# Altium footprint library connectors.PcbLib: 256 footprints (part 13 of 16)
Each footprint in its own frame and in the unit in brackets; x right, y up, seen from the top. Pads: shape width x height; smd on the part's side, far side on the other; paste and mask are expansions set on the pad; w line width, h text height; cw(c..) or ccw(c..) is an arc to the next point about the centre after c.
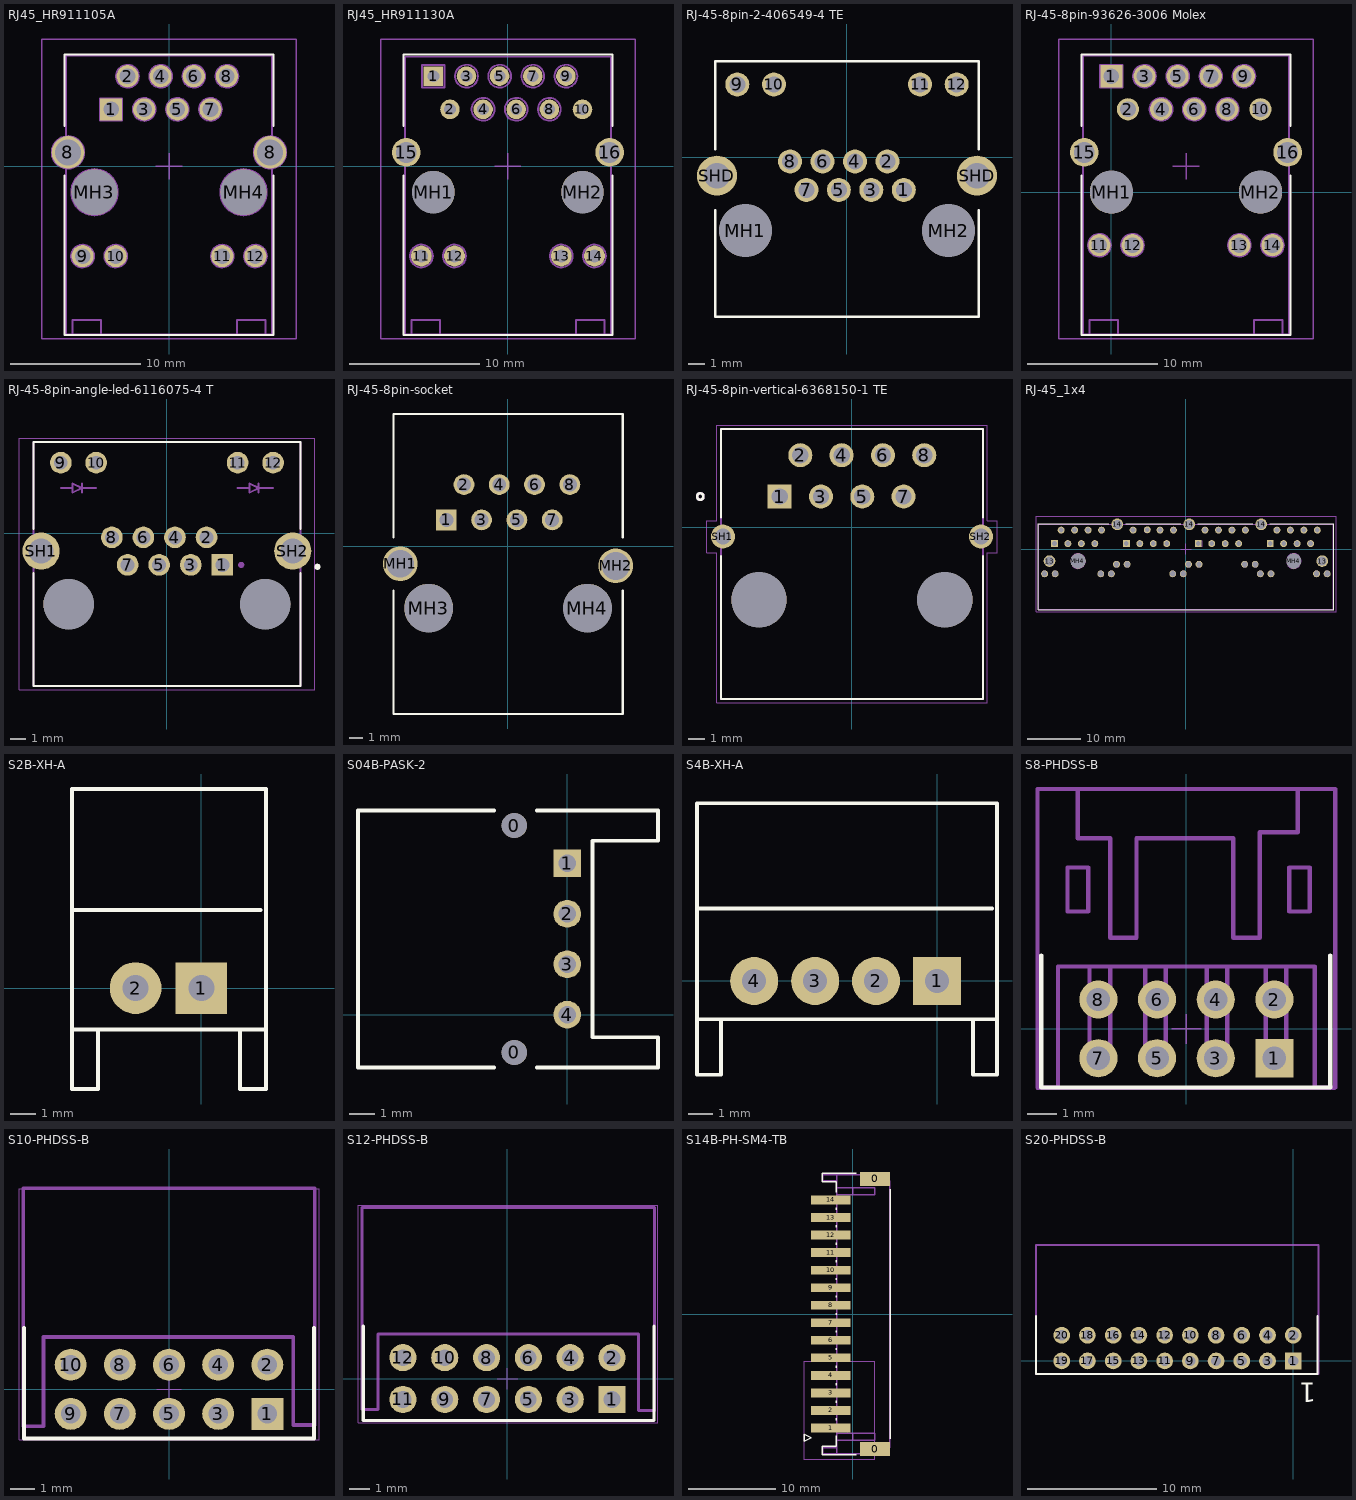
[diagram p12: the footprints below, top view; thin cyan lines are the x and y axes]

## RJ45_HR911105A [mm] "розетка на плату с трансформатором"
height 13
pads (16):
  rect 1.7x1.7 hole 1.2: 1(-4.44,4.355)
  round 1.7 hole 1.2: 2(-3.18,6.895) 3(-1.9,4.355) 4(-0.64,6.895) 5(0.64,4.355) 6(1.9,6.895) 7(3.18,4.355) 8(4.44,6.895) 9(-6.625,-6.895) 10(-4.085,-6.895) 11(4.085,-6.895) 12(6.625,-6.895)
  round 2.5 hole 2: 8(-7.745,1.055) 8(7.745,1.055)
  round 3.5 hole 3.5 unplated: MH3(-5.715,-1.995) MH4(5.715,-1.995)
Top Overlay:
  lines w0.15: -8,-0.725 -8,-12.95 8,-12.95 8,-0.725 ; -8,3.085 -8,8.55 8,8.55 8,3.085
TopAssy 13:
  circle w0.15: c-3.18,6.895 r0.875
  circle w0.15: c-0.64,6.895 r0.875
  circle w0.15: c1.9,6.895 r0.875
  circle w0.15: c4.44,6.895 r0.875
  circle w0.15: c3.18,4.355 r0.875
  circle w0.15: c0.64,4.355 r0.875
  circle w0.15: c-1.9,4.355 r0.875
  circle w0.15: c6.625,-6.895 r0.875
  circle w0.15: c4.085,-6.895 r0.875
  circle w0.15: c-4.085,-6.895 r0.875
  circle w0.15: c-6.625,-6.895 r0.875
  circle w0.15: c-7.745,1.055 r1.246
  circle w0.15: c7.745,1.055 r1.246
  circle w0.15: c-5.715,-1.995 r1.775
  circle w0.15: c5.715,-1.995 r1.775
  lines w0.15: -7.4,-12.9 -7.4,-11.8 -5.2,-11.8 -5.2,-12.9 ; 5.2,-12.9 5.2,-11.8 7.4,-11.8 7.4,-12.9 ; -7.9,-12.9 7.9,-12.9 7.9,8.5 -7.9,8.5 -7.9,-12.9 ; -5.3,3.5 -5.3,5.2 -3.6,5.2 -3.6,3.5 -5.3,3.5
TopCourt 15:
  lines w0.1: -1,0 1,0 ; 0,-1 0,1 ; -9.75,-13.25 -9.75,9.75 9.75,9.75 9.75,-13.25 -9.75,-13.25
3D body "User Library-HR911105A.step": height 13.51, standoff -2.99, extent -7.93,-12.915 7.95,8.485

## RJ45_HR911130A [mm] "розетка на плату с трансформатором 1000"
height 13.5
pads (18):
  rect 1.5x1.5 hole 0.9: 1(-5.715,6.895)
  round 1.5 hole 0.9: 2(-4.445,4.355) 3(-3.175,6.895) 4(-1.905,4.355) 5(-0.635,6.895) 6(0.635,4.355) 7(1.905,6.895) 8(3.175,4.355) 9(4.445,6.895) 10(5.715,4.355)
  round 1.6 hole 1: 11(-6.635,-6.895) 12(-4.095,-6.895) 13(4.095,-6.895) 14(6.635,-6.895)
  round 2.2 hole 1.6: 15(-7.795,1.055) 16(7.795,1.055)
  round 3.25 hole 3.25 unplated: MH1(-5.715,-1.995) MH2(5.715,-1.995)
Top Overlay:
  lines w0.15: -7.995,-0.73 -7.995,-12.955 8.005,-12.955 8.005,-0.73 ; -7.995,3.08 -7.995,8.545 8.005,8.545 8.005,3.08
TopAssy 13:
  circle w0.15: c5.72,-2 r1
  circle w0.15: c-5.71,-2 r1
  circle w0.15: c7.795,1.05 r0.8
  circle w0.15: c-7.795,1.05 r0.8
  circle w0.15: c-6.635,-6.895 r0.875
  circle w0.15: c-4.095,-6.895 r0.875
  circle w0.15: c4.095,-6.895 r0.875
  circle w0.15: c6.635,-6.895 r0.875
  circle w0.15: c-1.905,4.355 r0.875
  circle w0.15: c0.635,4.355 r0.875
  circle w0.15: c3.175,4.355 r0.875
  circle w0.15: c4.445,6.895 r0.875
  circle w0.15: c1.905,6.895 r0.875
  circle w0.15: c-0.635,6.895 r0.875
  circle w0.15: c-3.175,6.895 r0.875
  lines w0.15: -7.395,-12.905 -7.395,-11.805 -5.195,-11.805 -5.195,-12.905 ; 5.205,-12.905 5.205,-11.805 7.405,-11.805 7.405,-12.905 ; -7.895,-12.905 -7.895,8.385 7.905,8.385 7.905,-12.905 -7.895,-12.905 ; -6.575,6.04 -6.575,7.74 -4.875,7.74 -4.875,6.04 -6.575,6.04
TopCourt 15:
  lines w0.1: -1,0 1,0 ; 0,-1 0,1 ; -9.745,-13.255 9.755,-13.255 9.755,9.745 -9.745,9.745 -9.745,-13.255
3D body "HANRUN HY911130A.STEP": height 13.51, standoff -3.04, extent -8.015,-12.915 8.025,8.385

## RJ-45-8pin-2-406549-4 TE [mm] "розетка на плату 2-406549-4 TE"
height 10
pads (16):
  round 1.5 hole 1: 1(3.55,-2.03) 2(2.53,-0.25) 3(1.52,-2.03) 4(0.5,-0.25) 5(-0.51,-2.03) 6(-1.53,-0.25) 7(-2.54,-2.03) 8(-3.56,-0.25) 9(-6.86,4.57) 10(-4.57,4.57) 11(4.57,4.57) 12(6.86,4.57)
  round 3.3 hole 3.3: MH1(-6.35,-4.57) MH2(6.35,-4.57)
  round 2.5 hole 1.6: SHD(-8.13,-1.14) SHD(8.13,-1.14)
Top Overlay:
  lines w0.15: -8.25,-3.3 -8.25,-9.97 8.25,-9.97 8.25,-3.3 ; -8.25,0.51 -8.25,6.03 8.25,6.03 8.25,0.51
3D body "c-2-406549-4-r-3d.stp": height 14.57, standoff -4.15, extent -9.321,-10.818 9.322,5.903

## RJ-45-8pin-93626-3006 Molex [mm] "розетка на плату с трансформатором 1000"
height 13
pads (18):
  rect 1.7x1.7 hole 1.2: 1(0,8.89)
  round 1.7 hole 1.2: 2(1.27,6.35) 3(2.54,8.89) 4(3.81,6.35) 5(5.08,8.89) 6(6.35,6.35) 7(7.62,8.89) 8(8.89,6.35) 9(10.16,8.89) 10(11.43,6.35) 11(-0.92,-4.07) 12(1.62,-4.07) 13(9.81,-4.07) 14(12.35,-4.07)
  round 2.2 hole 1.6: 15(-2.08,3.05) 16(13.51,3.05)
  round 3.3 hole 3.3 unplated: MH1(0,0) MH2(11.43,0)
Top Overlay:
  lines w0.15: -2.28,1.265 -2.28,-10.96 13.72,-10.96 13.72,1.265 ; -2.28,5.075 -2.28,10.54 13.72,10.54 13.72,5.075
TopAssy 13:
  circle w0.15: c2.54,8.89 r0.875
  circle w0.15: c5.08,8.89 r0.875
  circle w0.15: c7.62,8.89 r0.875
  circle w0.15: c10.16,8.89 r0.875
  circle w0.15: c8.89,6.35 r0.875
  circle w0.15: c6.35,6.35 r0.875
  circle w0.15: c3.81,6.35 r0.875
  circle w0.15: c12.35,-4.07 r0.875
  circle w0.15: c9.81,-4.07 r0.875
  circle w0.15: c1.62,-4.07 r0.875
  circle w0.15: c-0.92,-4.07 r0.875
  circle w0.15: c-2.08,3.045 r0.8
  circle w0.15: c13.51,3.045 r0.8
  circle w0.15: c0.005,-0.005 r1
  circle w0.15: c11.435,-0.005 r1
  lines w0.15: -1.68,-10.91 -1.68,-9.81 0.52,-9.81 0.52,-10.91 ; 10.92,-10.91 10.92,-9.81 13.12,-9.81 13.12,-10.91 ; -2.18,-10.91 13.62,-10.91 13.62,10.49 -2.18,10.49 -2.18,-10.91 ; -0.86,8.035 0.84,8.035 0.84,9.735 -0.86,9.735 -0.86,8.035
TopCourt 15:
  lines w0.1: 4.72,1.99 6.72,1.99 ; 5.72,0.99 5.72,2.99 ; -4.03,-11.26 -4.03,11.74 15.47,11.74 15.47,-11.26 -4.03,-11.26
3D body "936263006.stp": height 15.21, standoff -3.29, extent -3.361,-10.8 14.791,10.57

## RJ-45-8pin-angle-led-6116075-4 T [mm] "RJ-45-8pin-angle-led-6116075-4 T"
pads (16):
  rect 1.4x1.4 hole 0.9: 1(3.58,-2.03)
  round 1.4 hole 0.9: 2(2.56,-0.25) 3(1.54,-2.03) 4(0.52,-0.25) 5(-0.5,-2.03) 6(-1.52,-0.25) 7(-2.54,-2.03) 8(-3.56,-0.25) 9(-6.86,4.57) 10(-4.57,4.57) 11(4.57,4.57) 12(6.86,4.57)
  round 2.4 hole 1.6: SH1(-8.13,-1.14) SH2(8.13,-1.14)
  round 3.25 hole 3.25 unplated: ""(-6.35,-4.57) ""(6.35,-4.57)
Top Overlay:
  circle w0.2: c9.727,-2.157 r0.1
  lines w0.127: -8.635,-2.55 -8.635,-9.85 8.635,-9.85 8.635,-2.55 ; -8.635,0.27 -8.635,5.9 8.635,5.9 8.635,0.27
TopAssy 13:
  circle w0.2: c4.8,-2.03 r0.1
  lines w0.127: -6.86,2.93 -6.1,2.93 ; -5.5,2.63 -5.5,2.93 ; -5.5,3.23 -5.5,2.93 ; -4.57,2.93 -5.5,2.93 ; 4.57,2.93 5.33,2.93 ; 5.93,2.63 5.93,2.93 ; 5.93,3.23 5.93,2.93 ; 6.86,2.93 5.93,2.93 ; -6.1,2.93 -6.1,2.63 -5.5,2.93 ; -6.1,2.93 -6.1,3.23 -5.5,2.93 ; 5.33,2.93 5.33,2.63 5.93,2.93 ; 5.33,2.93 5.33,3.23 5.93,2.93 ; -8.635,-9.85 8.635,-9.85 8.635,5.9 -8.635,5.9 -8.635,-9.85
TopCourt 15:
  lines w0.05: -9.56,-10.1 9.56,-10.1 9.56,6.15 -9.56,6.15 -9.56,-10.1
3D body "c-6116075-04-a-3d.stp": height 13.35, standoff -4.18, extent -8.299,-10.818 8.337,5.895

## RJ-45-8pin-socket [mm] "розетка на плату"
height 10
pads (12):
  rect 1.5x1.5 hole 1: 1(-4.44,1.905)
  round 1.5 hole 1: 2(-3.17,4.445) 3(-1.9,1.905) 4(-0.63,4.445) 5(0.64,1.905) 6(1.91,4.445) 7(3.18,1.905) 8(4.45,4.445)
  round 2.5 hole 2: MH1(-7.75,-1.255) MH2(7.75,-1.405)
  round 3.5 hole 3.5: MH3(-5.71,-4.445) MH4(5.72,-4.445)
Top Overlay:
  lines w0.15: -8.25,-3.175 -8.25,-12.065 8.26,-12.065 8.26,-3.175 ; -8.25,0.635 -8.25,9.525 8.26,9.525 8.26,0.635
3D body "User Library-rj45.step": height 11.5, standoff -3.3, extent -7.55,-11.9 7.55,5.7

## RJ-45-8pin-vertical-6368150-1 TE [mm] "розетка на плату 6368150-1 вертикальная"
height 16
pads (12):
  rect 1.478x1.478 hole 1: 1(-4.445,1.905)
  round 1.478 hole 1: 2(-3.175,4.445) 3(-1.905,1.905) 4(-0.635,4.445) 5(0.635,1.905) 6(1.905,4.445) 7(3.175,1.905) 8(4.445,4.445) SH1(-7.935,-0.555) SH2(7.935,-0.555)
  round 3.4 hole 3.4 unplated: ""(-5.715,-4.445) ""(5.715,-4.445)
Top Overlay:
  circle w0.152: c-9.33,1.905 r0.2
  lines w0.127: -8.06,-10.535 8.06,-10.535 ; -8.06,-10.495 -8.06,-1.745 ; -8.06,0.63 -8.06,6.005 ; -8.06,6.045 8.06,6.045 ; 8.06,-10.495 8.06,-1.745 ; 8.06,0.63 8.06,6.005
TopAssy 13:
  circle w0.152: c-9.33,1.905 r0.2
  lines w0.127: -8.06,-10.535 8.06,-10.535 ; -8.06,-10.495 -8.06,6.005 ; -8.06,6.045 8.06,6.045 ; 8.06,-10.495 8.06,6.005
TopCourt 15:
  lines w0.05: -8.92,-1.545 -8.92,0.425 -8.31,0.425 -8.31,6.295 8.31,6.295 8.31,0.425 8.92,0.425 8.92,-1.545 8.31,-1.545 8.31,-10.785 -8.31,-10.785 -8.31,-1.545 -8.92,-1.545
3D body "c-6368150-1-a-3d.stp": height 16.84, standoff -3.97, extent -8.06,-10.851 8.06,5.825

## RJ-45_1x4 [mm] "розетка на плату  MC001523 MULTICOMP"
height 10
pads (55):
  rect 1.3x1.3 hole 0.9: 1.1(-24.8,1.035) 2.1(-11.23,1.035) 3.1(2.34,1.035) 4.1(15.91,1.035)
  round 1.3 hole 0.9: 1.2(-23.53,3.575) 1.3(-22.26,1.035) 1.4(-20.99,3.575) 1.5(-19.72,1.035) 1.6(-18.45,3.575) 1.7(-17.18,1.035) 1.8(-15.91,3.575) 2.2(-9.96,3.575) 2.3(-8.69,1.035) 2.4(-7.275,3.635) 2.5(-6.15,1.035) 2.6(-4.88,3.575) 2.7(-3.61,1.035) 2.8(-2.34,3.575) 3.2(3.61,3.575) 3.3(4.88,1.035) 3.4(6.15,3.575) 3.5(7.42,1.035) 3.6(8.69,3.575) 3.7(9.96,1.035) 3.8(11.23,3.575) 4.2(17.18,3.575) 4.3(18.45,1.035) 4.4(19.72,3.575) 4.5(20.99,1.035) 4.6(22.26,3.575) 4.7(23.53,1.035) 4.8(24.8,3.575)
  round 1.3 hole 1: 1.9(-26.655,-4.665) 1.10(-24.655,-4.665) 1.11(-16.055,-4.665) 1.12(-14.055,-4.665) 2.9(-13.085,-2.865) 2.10(-11.085,-2.865) 2.11(-2.485,-4.665) 2.12(-0.485,-4.665) 3.9(0.485,-2.865) 3.10(2.485,-2.865) 3.11(11.085,-2.865) 3.12(13.085,-2.865) 4.9(14.055,-4.665) 4.10(16.055,-4.665) 4.11(24.655,-4.665) 4.12(26.655,-4.665)
  round 2.2 hole 1.7: 13(-25.725,-2.265) 13(25.725,-2.265) 14(-12.935,4.665) 14(0.635,4.665) 14(14.205,4.665)
  round 2.8 hole 2.8 unplated: MH4(-20.355,-2.265) MH4(20.355,-2.265)
Top Overlay:
  lines w0.15: -14.575,4.765 -27.875,4.765 -27.875,4.135 -27.875,-11.465 27.935,-11.465 27.935,4.765 15.825,4.765 ; -11.375,4.765 -0.975,4.765 ; 2.225,4.765 12.625,4.765
TopAssy 13:
  circle w0.15: c-25.725,-2.265 r0.85
  circle w0.15: c-12.935,4.665 r0.85
  circle w0.15: c0.635,4.665 r0.85
  circle w0.15: c14.205,4.665 r0.85
  circle w0.15: c2.485,-2.865 r0.5
  circle w0.15: c0.485,-2.865 r0.5
  circle w0.15: c-2.485,-4.665 r0.5
  circle w0.15: c-0.485,-4.665 r0.5
  circle w0.15: c-11.085,-2.865 r0.5
  circle w0.15: c-13.085,-2.865 r0.5
  circle w0.15: c13.085,-2.865 r0.5
  circle w0.15: c11.085,-2.865 r0.5
  circle w0.15: c20.355,-2.265 r1.4
  circle w0.15: c25.725,-2.265 r0.85
  circle w0.15: c14.055,-4.665 r0.5
  circle w0.15: c16.055,-4.665 r0.5
  circle w0.15: c24.655,-4.665 r0.5
  circle w0.15: c26.655,-4.665 r0.5
  circle w0.15: c17.17,3.575 r0.45
  circle w0.15: c19.71,3.575 r0.45
  circle w0.15: c22.25,3.575 r0.45
  circle w0.15: c24.79,3.575 r0.45
  circle w0.15: c23.53,1.035 r0.45
  circle w0.15: c20.99,1.035 r0.45
  circle w0.15: c18.45,1.035 r0.45
  circle w0.15: c4.88,1.035 r0.45
  circle w0.15: c7.42,1.035 r0.45
  circle w0.15: c9.96,1.035 r0.45
  circle w0.15: c11.22,3.575 r0.45
  circle w0.15: c8.68,3.575 r0.45
  circle w0.15: c6.14,3.575 r0.45
  circle w0.15: c3.6,3.575 r0.45
  circle w0.15: c-23.54,3.575 r0.45
  circle w0.15: c-21,3.575 r0.45
  circle w0.15: c-18.46,3.575 r0.45
  circle w0.15: c-15.92,3.575 r0.45
  circle w0.15: c-17.18,1.035 r0.45
  circle w0.15: c-19.72,1.035 r0.45
  circle w0.15: c-22.26,1.035 r0.45
  circle w0.15: c-8.69,1.035 r0.45
  circle w0.15: c-6.15,1.035 r0.45
  circle w0.15: c-3.61,1.035 r0.45
  circle w0.15: c-2.35,3.575 r0.45
  circle w0.15: c-4.89,3.575 r0.45
  circle w0.15: c-7.43,3.575 r0.45
  circle w0.15: c-9.97,3.575 r0.45
  circle w0.15: c-20.355,-2.265 r1.4
  circle w0.15: c-14.055,-4.665 r0.5
  circle w0.15: c-16.055,-4.665 r0.5
  circle w0.15: c-24.655,-4.665 r0.5
  circle w0.15: c-26.655,-4.665 r0.5
  lines w0.15: -27.775,-11.365 -27.775,4.665 27.825,4.665 27.825,-11.365 -27.775,-11.365 ; -25.275,0.535 -25.275,1.535 -24.275,1.535 -24.275,0.535 -25.275,0.535 ; -11.705,0.535 -10.705,0.535 -10.705,1.535 -11.705,1.535 -11.705,0.535 ; 2.05,0.535 3.05,0.535 3.05,1.535 2.05,1.535 2.05,0.535 ; 15.435,0.535 16.435,0.535 16.435,1.535 15.435,1.535 15.435,0.535
TopCourt 15:
  lines w0.1: -1,0 1,0 ; 0,-1 0,1 ; -28.275,-11.865 28.325,-11.865 28.325,6.235 -28.275,6.235 -28.275,-11.865
3D body "c-1734324-3-a-3d.stp": height 11.32, standoff -2.18, extent 11.525,-11.215 27.725,4.135
3D body "c-1734324-3-a-3d.stp": height 11.32, standoff -2.18, extent -1.775,-11.315 14.425,4.035
3D body "c-1734324-3-a-3d.stp": height 11.32, standoff -2.18, extent -14.975,-11.315 1.225,4.035
3D body "c-1734324-3-a-3d.stp": height 11.32, standoff -2.18, extent -27.775,-11.415 -11.575,3.935

## S2B-XH-A [mm] "Вилка на плату угловая, шаг 2.54мм"
height 2.65
pads (2):
  rect 2x2 hole 1: 1(0,0)
  round 2 hole 1: 2(-2.54,0)
Top Overlay:
  lines w0.15: -5,-1.6 2.4,-1.6 ; -5,3.02 2.3,3.02 ; -4,-1.6 -4,-3.9 -5,-3.9 -5,7.7 2.5,7.7 2.5,-3.9 1.5,-3.9 1.5,-1.6
3D body "S2B-XH-A-1.STEP": height 5.95, standoff -3.4, extent -5,-3.85 2.4,7.65

## S04B-PASK-2 [mm] "Гнездо на плату, угловое JST S04B-PASK-2"
height 6.5
pads (6):
  round 1 hole 1 unplated: 0(-2.1,-1.5) 0(-2.1,7.5)
  rect 1.1x1.1 hole 0.7: 1(0,6)
  round 1.1 hole 0.7: 2(0,4) 3(0,2) 4(0,0)
Top Overlay:
  lines w0.15: -2.9,-2.1 -8.3,-2.1 -8.3,8.1 -2.9,8.1 ; -1.2,-2.1 3.6,-2.1 3.6,-0.9 1,-0.9 1,6.9 3.6,6.9 3.6,8.1 -1.2,8.1
3D body "S04B-PASK-2.STEP": height 6.51, standoff -3.39, extent -8.2,-2 3.5,8

## S4B-XH-A [mm] "Вилка на плату угловая, шаг 2.54мм"
height 2.65
pads (4):
  rect 2x2 hole 1: 1(0,0)
  round 2 hole 1: 2(-2.54,0) 3(-5.08,0) 4(-7.62,0)
Top Overlay:
  lines w0.15: -10,3.02 2.3,3.02 ; -9.9,-1.6 2.4,-1.6 ; -9,-1.6 -9,-3.9 -10,-3.9 -10,7.4 2.5,7.4 2.5,-3.9 1.5,-3.9 1.5,-1.6
3D body "S4B-XH-A-1.STEP": height 6.25, standoff -3.3, extent -10,-3.95 2.4,7.55

## S8-PHDSS-B [mm]
pads (8):
  rect 1.3x1.3 hole 0.8: 1(3,-1)
  round 1.3 hole 0.8: 2(3,1) 3(1,-1) 4(1,1) 5(-1,-1) 6(-1,1) 7(-3,-1) 8(-3,1)
Top Overlay:
  lines w0.15: -4.95,2.5 -4.95,-2 4.9,-2 4.9,2.5
TopAssy 13:
  lines w0.15: -3.7,8.175 -3.7,6.5 -2.6,6.5 -2.6,3.1 -1.7,3.1 -1.7,6.5 1.6,6.5 1.6,3.1 2.5,3.1 2.5,6.7 3.8,6.7 3.8,8.175 ; -3.3,2.1 -3.3,-1.3 -2.6,-1.3 -2.6,2.1 ; -1.4,2.125 -1.4,-1.275 -0.7,-1.275 -0.7,2.125 ; 0.7,2.125 0.7,-1.275 1.4,-1.275 1.4,2.125 ; 2.7,2.125 2.7,-1.275 3.4,-1.275 3.4,2.125 ; 3.475,-1.35 3.475,-0.5 2.6,-0.5 2.6,-1.35 3.475,-1.35 ; 3.475,-1.35 3.475,-1.35 ; -5.075,-2 -5.075,8.175 5.075,8.175 5.075,-2 4.375,-2 4.375,2.125 -4.375,2.125 -4.375,-2 -5.075,-2 ; -4.05,4 -3.35,4 -3.35,5.5 -4.05,5.5 -4.05,4 ; 3.5,4 3.5,5.5 4.2,5.5 4.2,4 3.5,4
TopCourt 15:
  lines w0.05: -0.5,0 0.5,0 ; 0,-0.5 0,0.5 ; -5.1,-2.05 5.075,-2.05 5.075,8.15 -5.1,8.15 -5.1,-2.05
3D body "S8B-PHDSS_cream.STEP": height 5, standoff -3, extent -4.95,-1.5 4.95,8

## S10-PHDSS-B [mm]
pads (10):
  rect 1.3x1.3 hole 0.8: 1(4,-1)
  round 1.3 hole 0.8: 2(4,1) 3(2,-1) 4(2,1) 5(0,-1) 6(0,1) 7(-2,-1) 8(-2,1) 9(-4,-1) 10(-4,1)
Top Overlay:
  lines w0.15: -5.9,2.5 -5.9,-2 5.9,-2 5.9,2.5
TopAssy 13:
  lines w0.15: 4.45,-1.4 3.575,-1.4 3.575,-0.55 4.45,-0.55 4.45,-1.4 ; 4.45,-1.4 4.45,-1.4 ; -5.925,-1.5 -5.1,-1.5 -5.1,2.125 5.05,2.125 5.05,-1.45 5.925,-1.45 5.925,8.175 -5.925,8.175 -5.925,-1.5
TopCourt 15:
  lines w0.05: -0.5,0 0.5,0 ; 0,-0.5 0,0.5 ; -6.1,-2.05 -6.1,8.15 6.1,8.15 6.1,-2.05 -6.1,-2.05
3D body "S10B-PHDSS_cream.STEP": height 5, standoff -3, extent -6,-1.45 5.9,8.05

## S12-PHDSS-B [mm]
pads (12):
  rect 1.3x1.3 hole 0.8: 1(5,-1)
  round 1.3 hole 0.8: 2(5,1) 3(3,-1) 4(3,1) 5(1,-1) 6(1,1) 7(-1,-1) 8(-1,1) 9(-3,-1) 10(-3,1) 11(-5,-1) 12(-5,1)
Top Overlay:
  lines w0.15: -6.9,2.5 -6.9,-2 7,-2 7,2.5
TopAssy 13:
  lines w0.15: 5.475,-1.425 4.6,-1.425 4.6,-0.575 5.475,-0.575 5.475,-1.425 ; 5.475,-1.425 5.475,-1.425 ; -6.95,-1.475 -6.2,-1.475 -6.2,2.125 6.275,2.125 6.275,-1.525 7.025,-1.525 7.025,8.175 -6.95,8.175 -6.95,-1.475
TopCourt 15:
  lines w0.05: -0.5,0 0.5,0 ; 0,-0.5 0,0.5 ; -7.15,-2.125 -7.15,8.3 7.2,8.3 7.2,-2.125 -7.15,-2.125
3D body "S12B-PHDSS-B_cream.STEP": height 5, standoff -3, extent -6.95,-1.5 6.95,8

## S14B-PH-SM4-TB [mm] "2 mm Contact Pitch, Board-to-Cable, JST"
height 6.6
pads (16):
  rect 3.4x1.6 smd: 0(2.525,-15.4) 0(2.525,15.4)
  rect 4.5x1 smd: 1(-2.525,-13) 2(-2.525,-11) 3(-2.525,-9) 4(-2.525,-7) 5(-2.525,-5) 6(-2.525,-3) 7(-2.525,-1) 8(-2.525,1) 9(-2.525,3) 10(-2.525,5) 11(-2.525,7) 12(-2.525,9) 13(-2.525,11) 14(-2.525,13)
Top Overlay:
  lines w0.15: -1.925,-13.9 -1.925,-15.1 -3.525,-15.1 -3.525,-16.05 0.375,-16.05 ; -1.925,-12.1 -1.925,-11.9 ; -1.925,-10.1 -1.925,-9.9 ; -1.925,-8.1 -1.925,-7.9 ; -1.925,-6.1 -1.925,-5.9 ; -1.925,-4.1 -1.925,-3.9 ; -1.925,-2.1 -1.925,-1.9 ; -1.925,-0.1 -1.925,0.1 ; -1.925,1.9 -1.925,2.1 ; -1.925,3.9 -1.925,4.1 ; -1.925,5.9 -1.925,6.1 ; -1.925,7.9 -1.925,8.1 ; -1.925,9.9 -1.925,10.1 ; -1.925,11.9 -1.925,12.1 ; -1.925,13.9 -1.925,15.1 -3.525,15.1 -3.525,16.05 0.375,16.05 ; 4.275,-14.2 4.275,14.2 ; -5.525,-14.5 -4.725,-14.1 -5.525,-13.7 -5.525,-14.5
TopAssy 13:
  lines w0.15: -1.825,-15.25 -3.425,-15.25 -3.425,-15.95 -1.825,-15.95 ; -1.825,-14.4 2.475,-14.4 2.475,-13.6 -1.825,-13.6 ; -1.825,-13.1 -3.775,-13.1 -3.775,-12.8 -1.825,-12.8 ; -1.825,-11.1 -3.775,-11.1 -3.775,-10.8 -1.825,-10.8 ; -1.825,-9.1 -3.775,-9.1 -3.775,-8.8 -1.825,-8.8 ; -1.825,-7.1 -3.775,-7.1 -3.775,-6.8 -1.825,-6.8 ; -1.825,-5.1 -3.775,-5.1 -3.775,-4.8 -1.825,-4.8 ; -1.825,-3.1 -3.775,-3.1 -3.775,-2.8 -1.825,-2.8 ; -1.825,-1.1 -3.775,-1.1 -3.775,-0.8 -1.825,-0.8 ; -1.825,0.9 -3.775,0.9 -3.775,1.2 -1.825,1.2 ; -1.825,2.9 -3.775,2.9 -3.775,3.2 -1.825,3.2 ; -1.825,4.9 -3.775,4.9 -3.775,5.2 -1.825,5.2 ; -1.825,6.9 -3.775,6.9 -3.775,7.2 -1.825,7.2 ; -1.825,8.9 -3.775,8.9 -3.775,9.2 -1.825,9.2 ; -1.825,10.9 -3.775,10.9 -3.775,11.2 -1.825,11.2 ; -1.825,12.9 -3.775,12.9 -3.775,13.2 -1.825,13.2 ; -1.825,13.6 2.475,13.6 2.475,14.4 -1.825,14.4 ; -1.825,15.2 -3.425,15.2 -3.425,15.9 -1.825,15.9 ; -0.025,-14.4 -0.025,-13.6 ; -0.025,13.6 -0.025,14.4 ; -1.825,-15.95 -1.825,15.9 ; -1.825,-15.95 3.475,-15.95 3.475,-15.25 4.175,-15.25 4.175,15.2 3.475,15.2 3.475,15.9 -1.825,15.9 ; -1.4,-13 -0.6,-13.4 -0.6,-12.6 -1.4,-13 ; 0.925,-16 3.975,-16 3.975,-14.8 0.925,-14.8 0.925,-16 ; 0.925,14.8 0.925,16 3.975,16 3.975,14.8 0.925,14.8
TopCourt 15:
  lines w0.05: -5.625,-16.575 -5.625,-5.4 2.475,-5.4 2.475,-16.575 -5.625,-16.575
3D body "S14B-PH-SM4-TB.STEP": height 5.6, standoff 0, extent -4.45,-15.975 4.15,15.925

## S20-PHDSS-B [mm]
pads (20):
  rect 1.3x1.3 hole 0.8: 1(0,0)
  round 1.3 hole 0.8: 2(0,2) 3(-2,0) 4(-2,2) 5(-4,0) 6(-4,2) 7(-6,0) 8(-6,2) 9(-8,0) 10(-8,2) 11(-10,0) 12(-10,2) 13(-12,0) 14(-12,2) 15(-14,0) 16(-14,2) 17(-16,0) 18(-16,2) 19(-18,0) 20(-18,2)
Top Overlay:
  lines w0.15: -20,3.5 -20,-1 1.9,-1 1.9,3.5
  text "1" at 1.8,-1.7 h1.52
TopAssy 13:
  lines w0.15: -20,-1 -20,9 1.95,9 1.95,-1 -20,-1
3D body "S20B-PHDSS-B.STEP": height 5.1, standoff -2.9, extent -19.9,-0.5 2,9